# Altium integrated library CbyP.IntLib: 1144 symbols (part 3 of 6)
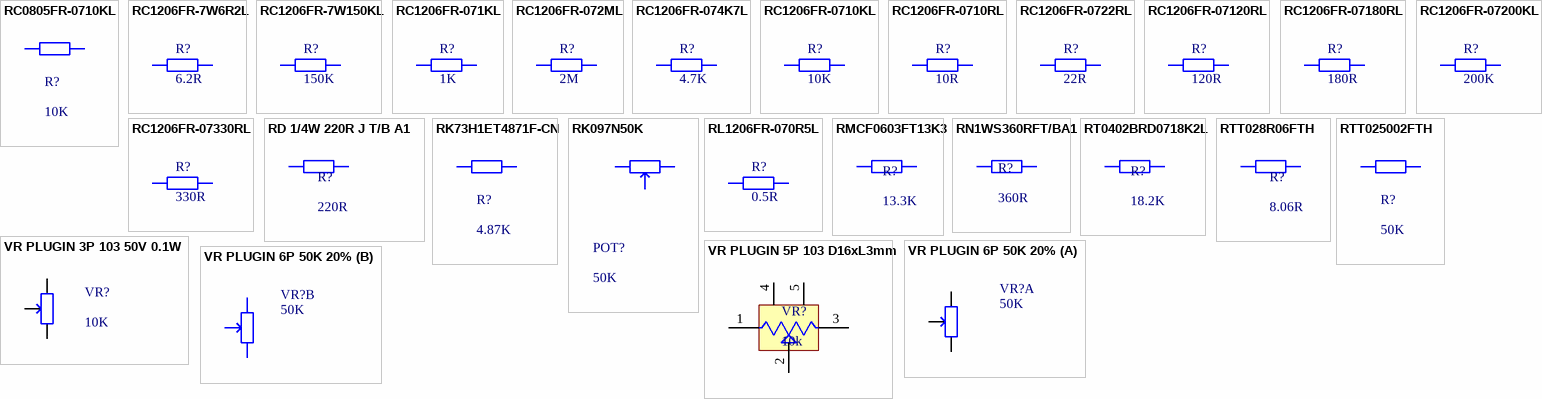
[diagram p43: symbols RC0805FR-0710KL to VR PLUGIN 6P 50K 20%]

## RC1206FR-0710KL
designator R?, comment 10K
RES 10kΩ ±1% 250mW 1206; Manufacturer: YAGEO; Mfr.Part #: RC1206FR-0710KL; LCSC Part #: C132649; Package: 1206
footprint RES-1206
pins: 1, 2

## RC1206FR-0710RL
designator R?, comment 10R
10Ω 250mW 200V Thick Film Resistor ±1% ±200ppm/℃ 1206 Chip Resistor - Surface Mount RoHS; Manufacturer: YAGEO; Mfr.Part #: RC1206FR-0710RL; LCSC Part #: C108080; Package: 1206; DigiKey Part Number: 311-10.0FRTR-ND
footprint RES-1206
pins: 1, 2

## RC1206FR-0722RL
designator R?, comment 22R
22Ω 250mW 200V Thick Film Resistor ±100ppm/℃ ±1% 1206 Chip Resistor - Surface Mount RoHS; Manufacturer: YAGEO; Mfr.Part #: RC1206FR-0722RL; Package: 1206; LCSC Part #: C114943; DigiKey Part Number: 311-22.0FRTR-ND
footprint RES-1206
pins: 1, 2

## RC1206FR-07120RL
designator R?, comment 120R
120Ω 250mW 200V ±100ppm/℃ Thick Film Resistor ±1% 1206 Chip Resistor - Surface Mount RoHS; Manufacturer: YAGEO; Mfr.Part #: RC1206FR-07120RL; Package: 1206; LCSC Part #: C114928; DigiKey Part Number: 311-120FRTR-ND
footprint RES-1206
pins: 1, 2

## RC1206FR-07180RL
designator R?, comment 180R
180Ω 250mW 200V Thick Film Resistor ±100ppm/℃ ±1% 1206 Chip Resistor - Surface Mount RoHS; Manufacturer: YAGEO; Mfr.Part #: RC1206FR-07180RL; LCSC Part #: C137380; Package: 1206; DigiKey Part Number: 311-180FRTR-ND
footprint RES-1206
pins: 1, 2

## RC1206FR-07200KL
designator R?, comment 200K
200kΩ 250mW 200V Thick Film Resistor ±100ppm/℃ ±1% 1206 Chip Resistor - Surface Mount RoHS; Manufacturer: YAGEO; Mfr.Part #: RC1206FR-07200KL; Package: 1206; LCSC Part #: C114937; DigiKey Part Number: 311-200KFRTR-ND
footprint RES-1206
pins: 1, 2

## RC1206FR-07330RL
designator R?, comment 330R
250mW 330Ω 200V Thick Film Resistor ±100ppm/℃ ±1% 1206 Chip Resistor - Surface Mount RoHS; Manufacturer: YAGEO; Mfr.Part #: RC1206FR-07330RL; LCSC Part #: C114944; Package: 1206; DigiKey Part Number: 311-330FRTR-ND
footprint RES-1206
pins: 1, 2

## RD 1/4W 220R J T/B A1
designator R?, comment 220R
Carbon Film Resistor 220Ω 250mW 0ppm/℃~+500ppm/℃ ±5% Through Hole,D2.4xL6.5mm Through Hole Resistors ROHS; Manufacturer: TyoHM; Mfr.Part #: RD 1/4W 220R J T/B A1; Package: Through Hole,D2.4xL6.5mm; LCSC Part #: C433749; DigiKey Part Number: NO
footprint Plugin,D2.4xL6.5mm
pins: 1, 2

## RK73H1ET4871F-CN
designator R?, comment 4.87K
62.5mW 4.87kΩ Thick Film Resistor ±1% 0402 Chip Resistor - Surface Mount RoHS; Manufacturer: ChipNobo; Mfr.Part #: RK73H1ET4871F-CN; Package: 0402; LCSC Part #: C42396694; DigiKey Part Number: NO
footprint RES-0402
pins: 1, 2

## RK097N50K
designator POT?, comment 50K
±10%  50kΩ Through Hole Carbon Film Potentiometer; Mfr.Part #: RK097N50K; Manufacturer: uxcell; Package: Through Hole; LCSC Part #: NO; DigiKey Part Number: NO; ComponentLink1Description: Link; ComponentLink2Description: Link 1
footprint RK097N-1
pins: 1, 2, 3

## RL1206FR-070R5L
designator R?, comment 0.5R
250mW 500mΩ ±300ppm/℃ Thick Film Resistor ±1% 1206 Chip Resistor - Surface Mount RoHS; Manufacturer: YAGEO; Mfr.Part #: RL1206FR-070R5L; LCSC Part #: C327075; Package: 1206; DigiKey Part Number: 311-0.5LWTR-ND
footprint RES-1206
pins: 1, 2

## RMCF0603FT13K3
designator R?, comment 13.3K
13.3 kOhms ±1% 0.1W, 1/10W Chip Resistor 0603 (1608 Metric) Automotive AEC-Q200 Thick Film; Manufacturer: Stackpole Electronics Inc; Mfr.Part #: RMCF0603FT13K3; Package: 0603; DigiKey Part Number: RMCF0603FT13K3TR-ND
footprint RES-0603
pins: 1, 2

## RN1WS360RFT/BA1
designator R?, comment 360R
360Ω 1W 350V Metal Film Resistor ±50ppm/℃ ±1% Through Hole,D3.3xL9.2mm Through Hole Resistors RoHS; Manufacturer: YAGEO; Mfr.Part #: RN1WS360ΩFT/BA1; Package: Through Hole,D3.3xL9.2mm; LCSC Part #: C385379; DigiKey Part Number: NO; ComponentLink1Description: Link; ComponentLink1URL: https://www.lcsc.com/product-detail/C108661.html?s_z=n_33r; ComponentLink2Description: Link 1
footprint Plugin,D3.3xL9.2mm
pins: 1, 2

## RT0402BRD0718K2L
designator R?, comment 18.2K
62.5mW Thin Film Resistor 50V ±25ppm/℃ ±0.1% 18.2kΩ 0402 Chip Resistor - Surface Mount ROHS; Manufacturer: YAGEO; Mfr.Part #: RT0402BRD0718K2L; Package: 0402; LCSC Part #: C852578
footprint RES-0402
pins: 1, 2

## RTT028R06FTH
designator R?, comment 8.06R
62.5mW 8.06Ω 50V ±200ppm/℃ Thick Film Resistor ±1% 0402 Chip Resistor - Surface Mount ROHS; Manufacturer: RALEC; Mfr.Part #: RTT028R06FTH; Package: 0402; LCSC Part #: C166426
footprint RES-0402
pins: 1, 2

## RTT025002FTH
designator R?, comment 50K
50kΩ 62.5mW 50V ±100ppm/℃ Thick Film Resistor ±1% 0402 Chip Resistor - Surface Mount RoHS; Manufacturer: RALEC; Mfr.Part #: RTT025002FTH; Package: 0402; LCSC Part #: C166559; DigiKey Part Number: NO
footprint RES-0402
pins: 1, 2

## VR PLUGIN 3P 103 50V 0.1W
designator VR?, comment 10K
±25% 100mW 10kΩ Plugin Potentiometers, Variable Resistors ROHS; Manufacturer: BOCHEN(Chengdu Guosheng Tech); Mfr.Part #: RM063-103(10K); Name: VR PLUGIN 3P 103 50V 0.1W; So_Chan_Dan: 0; So_Chan_Cam: 3; Package: Plugin
footprint RM063
pins: 1, 2, 3

## VR PLUGIN 5P 103 D16xL3mm
designator VR?, comment 10k
Name: VR PLUGIN 5P 103 D16xL3mm; So_Chan_Cam: 3; So_Chan_Dan: 0; Mfr.Part #: ?; Manufacturer: ?; Package: ?; Link: ?
footprint BIEN_TRO_NGANG
pins: 1 CCW, 2 WIPER, 3 CW, 4, 5

## VR PLUGIN 6P 50K 20%
designator VR?, comment 50K
Through Hole; Package: Plugin
footprint VR-PLUGIN-2.5-6P-1
part A pins: 4, 5, 6
part B pins: 1, 2, 3


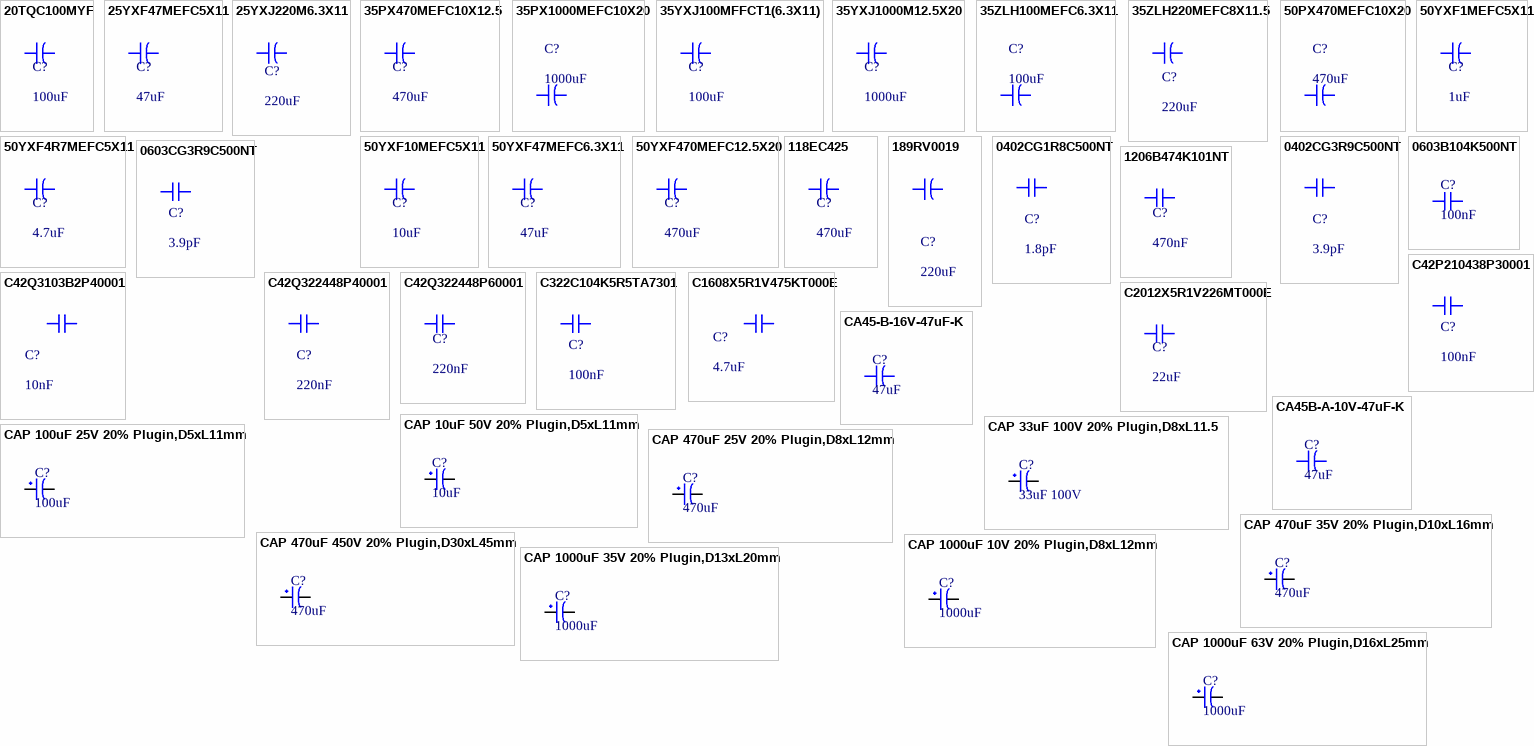
[diagram p13: symbols 20TQC100MYF to CAP 1000uF 63V 20% Plugin,D16xL25mm]

## 20TQC100MYF
designator C?, comment 100uF
100uF ±20% 20V Tantalum Capacitors 55mΩ@100kHz; Manufacturer: PANASONIC; Mfr.Part #: 20TQC100MYF; Package: SMD; LCSC Part #: C139578; DigiKey Part Number: P16503TR-ND; ComponentLink1Description: Link; ComponentLink1URL: https://www.lcsc.com/product-detail/C139578.html; ComponentLink2Description: Link 1; ComponentLink2URL: https://www.digikey.com/en/products/detail/panasonic-electronic-components/20TQC100MYF/4204835?s=N4IgTCBcDa4AwBUCKBhAjHOBZAmgMRAF0BfIA
footprint CAP_20TQC100MYF
pins: 1, 2

## 25YXF47MEFC5X11
designator C?, comment 47uF
47uF 25V Aluminum Electrolytic Capacitors Through Hole,D5xL11mm 5000hrs@105℃; Manufacturer: Rubycon; Mfr.Part #: 25YXF47MEFC5X11; Package: Through Hole,D5xL11mm; LCSC Part #: C88724; DigiKey Part Number: 1189-1858-ND; ComponentLink1Description: Link; ComponentLink1URL: https://www.lcsc.com/product-detail/C88724.html; ComponentLink2Description: Link 1; ComponentLink2URL: https://www.digikey.com/en/products/detail/rubycon/25YXF47MEFC5X11/3562864?s=N4IgTCBcDa4KwE0AaAxALAdgLIFEUGE4kBGYkAXQF8g
footprint PLUGIN,D5xL11mm
pins: 1, 2

## 25YXJ220M6.3X11
designator C?, comment 220uF
220uF 25V Aluminum Electrolytic Capacitors Through Hole,D6.3xL11mm 7000hrs@105℃; Manufacturer: Rubycon; Mfr.Part #: 25YXJ220M6.3X11; Package: Through Hole,D6.3xL11mm; LCSC Part #: C88729; DigiKey Part Number: 1189-2913-ND; ComponentLink1Description: Link; ComponentLink1URL: https://www.lcsc.com/product-detail/C88729.html; ComponentLink2Description: Link 1; ComponentLink2URL: https://www.digikey.com/en/products/detail/rubycon/25YXJ220M6-3X11/3563124?s=N4IgTCBcDa4KwE0AaApMYAMBZAbAOgGYkBGYkAXQF8g
footprint PLUGIN,D6.3xL12mm
pins: 1, 2

## 35PX470MEFC10X12.5
designator C?, comment 470uF
470uF 35V Aluminum Electrolytic Capacitors Through Hole,D10xL12.5mm 2000hrs@105℃; Manufacturer: Rubycon; Mfr.Part #: 35PX470MEFC10X12.5; Package: Through Hole,D10xL12.5mm; LCSC Part #: C127917; DigiKey Part Number: 1189-1280-ND; ComponentLink1Description: Link; ComponentLink1URL: https://www.lcsc.com/product-detail/C127917.html; ComponentLink2Description: Link 1; ComponentLink2URL: https://www.digikey.com/en/products/detail/rubycon/35PX470MEFC10X12-5/3134236?s=N4IgTCBcDaIMwFYAKANALAdgAwFkCiAYgMICMWKJYAdAiALoC%2BQA
footprint Plugin,D10xL12.5mm
pins: 1, 2

## 35PX1000MEFC10X20
designator C?, comment 1000uF
1000uF 35V Aluminum Electrolytic Capacitors Through Hole,D10xL20mm 2000hrs@105℃; Manufacturer: Rubycon; Mfr.Part #: 35PX1000MEFC10X20; So_Chan_Cam: 2; LCSC Part #: C136014; Package: Through Hole,D10xL20mm; DigiKey Part Number: 1189-1745-ND; ComponentLink1Description: Link; ComponentLink1URL: https://www.lcsc.com/product-detail/C136014.html?s_z=n_35PX1000MEFC10X20; ComponentLink2Description: Link 1; ComponentLink2URL: https://www.digikey.com/en/products/detail/rubycon/35PX1000MEFC10X20/3563769?s=N4IgTCBcDaIMwFYAKANAjABiwWQKIDEBhTFMDEAXQF8g
footprint Plugin,D10xL20mm
pins: 1, 2

## 35YXJ100MFFCT1(6.3X11)
designator C?, comment 100uF
100uF 35V Aluminum Electrolytic Capacitors Through Hole,D6.3xL11mm 7000hrs@105℃; Manufacturer: Rubycon; Mfr.Part #: 35YXJ100MFFCT1(6.3X11); Package: Through Hole,D6.3xL11mm; LCSC Part #: C3035369; DigiKey Part Number: NO; ComponentLink1Description: Link; ComponentLink1URL: https://www.lcsc.com/product-detail/C3035369.html?spm=wm.fly.bg.25.xh&lcsc_vid=FAdbA1BQFQNeV1UEFlgLA1FWRVFXUVBeEwJXVAFQRVUxVlNRQ1NbVF1fQ1ReUzsOAxUeFF5JWBYZEEoKFBINSQcJGk4dAgUUFAk%3D; ComponentLink2Description: Link 1
footprint PLUGIN,D6.3xL11mm
footprint PLUGIN,D6.3xL11mm-SIDE
pins: 1, 2

## 35YXJ1000M12.5X20
designator C?, comment 1000uF
1000uF 35V Aluminum Electrolytic Capacitors Through Hole,D12.5xL20mm 10000hrs@105℃; Manufacturer: Rubycon; Mfr.Part #: 35YXJ1000M12.5X20; Package: Through Hole,D12.5xL20mm; LCSC Part #: C88743; DigiKey Part Number: 1189-1295-ND; ComponentLink1Description: Link; ComponentLink1URL: https://www.lcsc.com/product-detail/C88743.html?s_z=n_35YXJ1000M12.5X20; ComponentLink2Description: Link 1; ComponentLink2URL: https://www.digikey.com/en/products/detail/rubycon/35YXJ1000M12-5X20/3134251?s=N4IgTCBcDaIMwFYCaANAUgRgAw4LIbADoEUwsQBdAXyA
footprint Plugin,D12.5xL20mm
pins: 1, 2

## 35ZLH100MEFC6.3X11
designator C?, comment 100uF
CAP ALUM 100uF ±20% 35V TH; Manufacturer: Rubycon; Mfr.Part #: 35ZLH100MEFC6.3X11; LCSC Part #: C109392; Package: Through Hole,D6.3xL11mm
footprint PLUGIN,D6.3xL11mm
pins: 1, 2

## 35ZLH220MEFC8X11.5
designator C?, comment 220uF
220uF 35V Aluminum Electrolytic Capacitors Through Hole,D8xL11.5mm 8000hrs@105℃; Manufacturer: Rubycon; Mfr.Part #: 35ZLH220MEFC8X11.5; LCSC Part #: C107639; Package: Through Hole,D8xL11.5mm; DigiKey Part Number: 1189-1863-ND; ComponentLink1Description: Link; ComponentLink1URL: https://www.lcsc.com/product-detail/C107639.html?s_z=n_35ZLH220MEFC8X11.5; ComponentLink2Description: Link 1; ComponentLink2URL: https://www.digikey.com/en/products/detail/rubycon/35ZLH220MEFC8X11-5/3563385?s=N4IgTCBcDaIMwFYBaAZAEmMAGAsgUQDEBhADgA0BGCgOgRAF0BfIA
footprint Plugin,D8xL11.5mm
pins: 1, 2

## 50PX470MEFC10X20
designator C?, comment 470uF
470uF 50V Aluminum Electrolytic Capacitors Through Hole,D10xL20mm 2000hrs@105℃; Manufacturer: Rubycon; Mfr.Part #: 50PX470MEFC10X20; LCSC Part #: C88733; Package: Through Hole,D10xL20mm; DigiKey Part Number: 1189-4213-ND; ComponentLink1Description: Link; ComponentLink1URL: https://www.lcsc.com/product-detail/C88733.html; ComponentLink2Description: Link 1; ComponentLink2URL: https://www.digikey.com/en/products/detail/rubycon/50PX470MEFC10X20/3563766?s=N4IgTCBcDaIKwAYAKANALAdgQWQKIDEBhARgRTARAF0BfIA
footprint Plugin,D10xL20mm
pins: 1, 2

## 50YXF1MEFC5X11
designator C?, comment 1uF
1uF 50V Aluminum Electrolytic Capacitors Through Hole,D5xL11mm; Manufacturer: Rubycon; Mfr.Part #: 50YXF1MEFC5X11; Package: Through Hole,D5xL11mm; LCSC Part #: C2927584; DigiKey Part Number: 1189-1878-ND; ComponentLink1Description: Link; ComponentLink1URL: https://www.lcsc.com/product-detail/C2927584.html; ComponentLink2Description: Link 1; ComponentLink2URL: https://www.digikey.com/en/products/detail/rubycon/50YXF1MEFC5X11/3562875?s=N4IgTCBcDaIKwAYCaANAYgRgLIFE0GE4UMMQBdAXyA
footprint PLUGIN,D5xL11mm
pins: 1, 2

## 50YXF4R7MEFC5X11
designator C?, comment 4.7uF
4.7uF 50V Aluminum Electrolytic Capacitors Through Hole,D5xL11mm 5000hrs@105℃; Manufacturer: Rubycon; Mfr.Part #: 50YXF4R7MEFC5X11; Package: Through Hole,D5xL11mm; LCSC Part #: C88759; DigiKey Part Number: 1189-1862-ND; ComponentLink1Description: Link; ComponentLink1URL: https://www.lcsc.com/product-detail/C88759.html; ComponentLink2Description: Link 1; ComponentLink2URL: https://www.digikey.com/en/products/detail/rubycon/50YXF4-7MEFC5X11/3562866?s=N4IgTCBcDaIKwAYCaANAYgFgEoHYCyAomgMJwoCM5IAugL5A
footprint PLUGIN,D5xL11mm
pins: 1, 2

## 50YXF10MEFC5X11
designator C?, comment 10uF
10uF 50V Aluminum Electrolytic Capacitors Through Hole,D5xL11mm 5000hrs@105℃; Manufacturer: Rubycon; Mfr.Part #: 50YXF10MEFC5X11; Package: Through Hole,D5xL11mm; LCSC Part #: C88726; DigiKey Part Number: 1189-1852-ND; ComponentLink1Description: Link; ComponentLink1URL: https://www.lcsc.com/product-detail/C88726.html; ComponentLink2Description: Link 1; ComponentLink2URL: http://digikey.com/en/products/detail/rubycon/50YXF10MEFC5X11/3562878?s=N4IgTCBcDaIKwAYCaANAYgRgQWQKJoGE4UMMQBdAXyA
footprint PLUGIN,D5xL11mm
pins: 1, 2

## 50YXF47MEFC6.3X11
designator C?, comment 47uF
47uF 50V Aluminum Electrolytic Capacitors Through Hole,D6.3xL11mm 5000hrs@105℃; Manufacturer: Rubycon; Mfr.Part #: 50YXF47MEFC6.3X11; Package: Through Hole,D6.3xL11mm; LCSC Part #: C107641; DigiKey Part Number: 1189-1854-ND; ComponentLink1Description: Link; ComponentLink1URL: https://www.lcsc.com/product-detail/C107641.html; ComponentLink2Description: Link 1; ComponentLink2URL: https://www.digikey.com/en/products/detail/rubycon/50YXF47MEFC6-3X11/3563091?s=N4IgTCBcDaIKwAYCaANAYgFgOwFkCiaAwgGwB0AzCgIxUgC6AvkA
footprint PLUGIN,D6.3xL11mm-SIDE
footprint PLUGIN,D6.3xL11mm-SIDE
pins: 1, 2

## 50YXF470MEFC12.5X20
designator C?, comment 470uF
470uF 50V Aluminum Electrolytic Capacitors Through Hole,D12.5xL20mm 10000hrs@105℃; Manufacturer: Rubycon; Mfr.Part #: 50YXF470MEFC12.5X20; Package: Through Hole,D12.5xL20mm; LCSC Part #: C88856; DigiKey Part Number: 1189-50YXF470MEFC12.5X20-ND; ComponentLink1Description: Link; ComponentLink1URL: https://www.lcsc.com/product-detail/C88856.html; ComponentLink2Description: Link 1; ComponentLink2URL: https://www.digikey.com/en/products/detail/rubycon/50YXF470MEFC12-5X20/3564022?s=N4IgTCBcDaIKwAYCaANAYgFgOwILIFE0BhARjADo4UwEQBdAXyA
footprint Plugin,D12.5xL20mm
pins: 1, 2

## 118EC425
designator C?, comment 470uF
CAP ALUM HYBRID 470uF ±20% 16V SMD; Manufacturer: KNSCHA; Mfr.Part #: 118EC425; Package: SMD,D8xL10mm; LCSC Part #: C46528077
footprint SMD,D8xL10mm
pins: 1, 2

## 189RV0019
designator C?, comment 220uF
220uF 35V 600mA@100KHz 160mΩ@100KHz ±20% SMD,D6.3xL7.7mm Aluminum Electrolytic Capacitors - SMD ROHS; Manufacturer: KNSCHA; Mfr.Part #: 189RV0019; Package: SMD,D6.3xL7.7mm; LCSC Part #: C7471881
footprint SMD,D6.3xL7.7mm
pins: 1, 2

## 0402CG1R8C500NT
designator C?, comment 1.8pF
CAP CER 1.8pF 50V C0G 0402; Manufacturer: FH; Mfr.Part #: 0402CG1R8C500NT; Package: 0402; LCSC Part #: C1553
footprint CAP-0402
pins: 1, 2

## 0402CG3R9C500NT
designator C?, comment 3.9pF
CAP CER 3.9pF 50V C0G 0402; Manufacturer: FH; Mfr.Part #: 0402CG3R9C500NT; Package: 0402; LCSC Part #: C1566
footprint CAP-0402
pins: 1, 2

## 0603B104K500NT
designator C?, comment 100nF
100nF ±10% 50V Ceramic Capacitor X7R 0603; Manufacturer: FH; Mfr.Part #: 0603B104K500NT; Package: 0603; LCSC Part #: C30926; DigiKey Part Number: NO; ComponentLink1Description: Link; ComponentLink1URL: https://www.lcsc.com/product-detail/C30926.html?s_z=n_0603B114K500NT; ComponentLink2Description: Link 1
footprint CAP-0603
pins: 1, 2

## 0603CG3R9C500NT
designator C?, comment 3.9pF
3.9pF 50V Ceramic Capacitor C0G 0603; Manufacturer: FH; Mfr.Part #: 0603CG3R9C500NT; Package: 0603; LCSC Part #: C1662; DigiKey Part Number: NO; ComponentLink1Description: Link; ComponentLink1URL: https://www.lcsc.com/product-detail/C1662.html?spm=wm.fly.bg.1.xh&lcsc_vid=QwdcUVxUFAdbVwUFRQBWBVECTlNYX1QAQFddU1EFQ1kxVlNRQ1NeVF1TQVhaVTsOAxUeFF5JWBYZEEoKFBINSQcJGk4dAgUUFAk%3D; ComponentLink2Description: Link 1
footprint CAP-0603
pins: 1, 2

## 1206B474K101NT
designator C?, comment 470nF
470nF ±10% 100V Ceramic Capacitor X7R 1206; Manufacturer: FH; Mfr.Part #: 1206B474K101NT; Package: 1206; LCSC Part #: C507059; DigiKey Part Number: NO; ComponentLink1Description: Link; ComponentLink1URL: https://www.lcsc.com/product-detail/C507059.html; ComponentLink2Description: Link 1
footprint CAP-1206 - 1
pins: 1, 2

## C42P210438P30001
designator C?, comment 100nF
CAP SAFETY 100nF ±10% 275V TH; Manufacturer: WALSON; Mfr.Part #: C42P210438P30001; Package: Through Hole,P=7.5mm; LCSC Part #: C46638855
footprint Through Hole, P=7.5mm, L=10mm, W=5mm, H=11mm
pins: 1, 2

## C42Q3103B2P40001
designator C?, comment 10nF
10nF ±10% 275V 310V Safety Capacitor X2 Through Hole,P=10mm; Manufacturer: WALSON; Mfr.Part #: CC0603JRX7R9BB103; Package: Through Hole,P=10mm; LCSC Part #: C46638843; DigiKey Part Number: NO; ComponentLink1Description: Link; ComponentLink1URL: https://www.lcsc.com/product-detail/C46638843.html; ComponentLink2Description: Link 1
footprint Through Hole, P=10mm, L=12mm, W=6mm,  H=12mm
pins: 1, 2

## C42Q322448P40001
designator C?, comment 220nF
CAP SAFETY 220nF ±10% 275V 310V TH; Manufacturer: WALSON; Mfr.Part #: C42Q322448P40001; Package: Through Hole,P=10mm; LCSC Part #: C46638866
footprint Through Hole, P=10mm, L=13mm, W=7mm, H=13mm
pins: 1, 2

## C42Q322448P60001
designator C?, comment 220nF
CAP SAFETY 220nF ±10% 275V 310V TH; Manufacturer: WALSON; Mfr.Part #: C42Q322448P60001; Package: Through Hole,P=15mm; LCSC Part #: C46638867
footprint Through Hole, P=15mm, L=18mm, W=6mm, H=12mm
pins: 1, 2

## C322C104K5R5TA7301
designator C?, comment 100nF
CAP CER 100nF 50V X7R TH; Manufacturer: KEMET; Mfr.Part #: C322C104K5R5TA7301; Package: Through Hole,P=5.08mm; LCSC Part #: C600235
footprint Through Hole,P=5.08mm
pins: 1, 2

## C1608X5R1V475KT000E
designator C?, comment 4.7uF
4.7uF ±10% 35V Ceramic Capacitor X5R 0603; Manufacturer: TDK; Mfr.Part #: C1608X5R1V475KT000E; Package: 0603; LCSC Part #: C329940; DigiKey Part Number: 445-9064-2-ND; ComponentLink1Description: Link; ComponentLink1URL: https://www.lcsc.com/product-detail/C329940.html?s_z=n_c329940; ComponentLink2Description: Link 1; ComponentLink2URL: https://www.digikey.com/en/products/detail/tdk-corporation/C1608X5R1V475K080AC/3648577?s=N4IgTCBcDaIMIEYBsAGAHADQKwCUEDUAWAdiwGkAVFagURAF0BfIA
footprint CAP-0603
pins: 1, 2

## C2012X5R1V226MT000E
designator C?, comment 22uF
22uF ±20% 35V Ceramic Capacitor X5R 0805; Manufacturer: TDK; Mfr.Part #: C2012X5R1V226MT000E; Package: 0805; LCSC Part #: C338080; DigiKey Part Number: 445-14428-2-ND; ComponentLink1Description: Link; ComponentLink1URL: https://www.lcsc.com/product-detail/C338080.html?spm=wm.fly.bg.0.xh&lcsc_vid=FAdbA1BQFQNeV1UEFlgLA1FWRVFXUVBeEwJXVAFQRVUxVlNRQ1NbU11QRVRcVTsOAxUeFF5JWBYZEEoKFBINSQcJGk4dAgUUFAk%3D; ComponentLink2Description: Link 1; ComponentLink2URL: https://www.digikey.com/en/products/detail/tdk/C2012X5R1V226M125AC/3951664?s=N4IgTCBcDaIMJgAwEYwA0CsAlZA1MYAbALIAqiFAoiALoC%2BQA
footprint CAP-0805
footprint CAP-0805-1
pins: 1, 2

## CA45-B-16V-47uF-K
designator C?, comment 47uF
47uF 16V 3Ω@100kHz ±10% CASE-B-3528-19(mm) Tantalum Capacitors ROHS; Manufacturer: CEC(Zhenhua XinYun); Mfr.Part #: CA45-B-16V-47uF-K; Package: CASE-B-3528-19(mm); LCSC Part #: C136751
footprint CASE-B-3528-19(mm)
pins: 1, 2

## CA45B-A-10V-47uF-K
designator C?, comment 47uF
47uF 10V ±10% CASE-A-3216-16(mm) Tantalum Capacitors ROHS; Manufacturer: CEC(Zhenhua XinYun); Mfr.Part #: CA45B-A-10V-47uF-K; Package: CASE-A-3216-16(mm); LCSC Part #: C41415735; DigiKey Part Number: NO
footprint CASE-A-3216-18(mm)
pins: 1, 2

## CAP 10uF 50V 20% Plugin,D5xL11mm
designator C?, comment 10uF
10uF 50V ±20% Plugin,D5xL11mm Aluminum Electrolytic Capacitors - Leaded ROHS; Manufacturer: AISHI(Aihua Group); Mfr.Part #: ERS1HM100D11OT; Name: CAP 10uF 50V 20% Plugin,D5xL11mm; So_Chan_Cam: 2; So_Chan_Dan: 0; Package: Plugin,D5xL11mm
footprint PLUGIN,D5xL11mm
pins: 1, 2

## CAP 33uF 100V 20% Plugin,D8xL11.5
designator C?, comment 33uF 100V
33uF 100V ±20% 140mA@120Hz Plugin,D8xL11.5mm Aluminum Electrolytic Capacitors - Leaded ROHS; Manufacturer: Rubycon; Mfr.Part #: 100PX33MEFC8X11.5; Name: CAP 33uF 100V 20% Plugin,D8xL11.5; So_Chan_Dan: 0; So_Chan_Cam: 2; Package: Plugin,D8xL11.5mm
footprint Plugin,D8xL11.5mm
pins: 1, 2

## CAP 100uF 25V 20% Plugin,D5xL11mm
designator C?, comment 100uF
100uF 25V ±20% Plugin,D5xL11mm Aluminum Electrolytic Capacitors - Leaded ROHS; Manufacturer: Rubycon; Mfr.Part #: 25YXJ100MT15X11; Name: CAP 100uF 25V 20% Plugin,D5xL11mm; So_Chan_Cam: 2; So_Chan_Dan: 0; Package: Plugin,D5xL11mm
footprint PLUGIN,D5xL11mm
pins: 1, 2

## CAP 470uF 25V 20% Plugin,D8xL12mm
designator C?, comment 470uF
470uF 25V ±20% Plugin,D8xL12mm Aluminum Electrolytic Capacitors - Leaded ROHS; Manufacturer: CX(Dongguan Chengxing Elec); Mfr.Part #: KM477M025F12RR0VH2FP0; Name: CAP 470uF 25V 20% Plugin,D8xL12mm; So_Chan_Dan: 0; So_Chan_Cam: 2; Package: Plugin,D8xL12mm
footprint Plugin,D8xL12mm
pins: 1, 2

## CAP 470uF 35V 20% Plugin,D10xL16mm
designator C?, comment 470uF
470uF 35V ±20% Plugin,D10xL16mm Aluminum Electrolytic Capacitors - Leaded ROHS; Manufacturer: Rubycon; Mfr.Part #: 35YXJ470M10x16; Name: CAP 470uF 35V 20% Plugin,D10xL16mm; So_Chan_Dan: 0; So_Chan_Cam: 2; Package: Plugin,D10xL16mm
footprint Plugin,D10xL16mm
pins: 1, 2

## CAP 470uF 450V 20% Plugin,D30xL45mm
designator C?, comment 470uF
470uF 450V 2.05A@120Hz ±20% 10mm Plugin,D30xL45mm Horn-Type Electrolytic Capacitors ROHS; Manufacturer: Rubycon; Mfr.Part #: 450MXH470MEFCSN30X45; Name: CAP 470uF 450V 20% Plugin,D30xL45mm; So_Chan_Dan: 0; So_Chan_Cam: 2; Package: Plugin,D30xL45mm
footprint Plugin,D30xL45mm
pins: 1, 2

## CAP 1000uF 10V 20% Plugin,D8xL12mm
designator C?, comment 1000uF
1000uF 10V ±20% 600mA@10kHz Plugin,D8xL12mm Aluminum Electrolytic Capacitors - Leaded ROHS; Manufacturer: Rubycon; Mfr.Part #: 10PX1000MEFC8X11.5; Name: CAP 1000uF 10V 20% Plugin,D8xL12mm; So_Chan_Dan: 0; So_Chan_Cam: 2; Package: Plugin,D8xL12mm
footprint Plugin,D8xL12mm
footprint Plugin,D8xL12mm-SIDE
pins: 1, 2

## CAP 1000uF 35V 20% Plugin,D13xL20mm
designator C?, comment 1000uF
1000uF 35V ±20% Plugin,D13xL20mm Aluminum Electrolytic Capacitors - Leaded ROHS; Manufacturer: CX(Dongguan Chengxing Elec); Mfr.Part #: KM108M035J20RR0VH2FP0; Name: CAP 1000uF 35V 20% Plugin,D13xL20mm; So_Chan_Dan: 0; So_Chan_Cam: 2; Package: Plugin,D13xL20mm
footprint Plugin,D13xL20mm
footprint Plugin,D13xL20mm-SIDE
pins: 1, 2

## CAP 1000uF 63V 20% Plugin,D16xL25mm
designator C?, comment 1000uF
1000uF 63V ±20% Plugin,D16xL25mm Aluminum Electrolytic Capacitors - Leaded ROHS; Manufacturer: Rubycon; Mfr.Part #: 63YXJ1000M16X25; Name: CAP 1000uF 63V 20% Plugin,D16xL25mm; So_Chan_Dan: 0; So_Chan_Cam: 2; Package: Plugin,D16xL25mm
footprint PLUGIN,D16xL25mm
pins: 1, 2

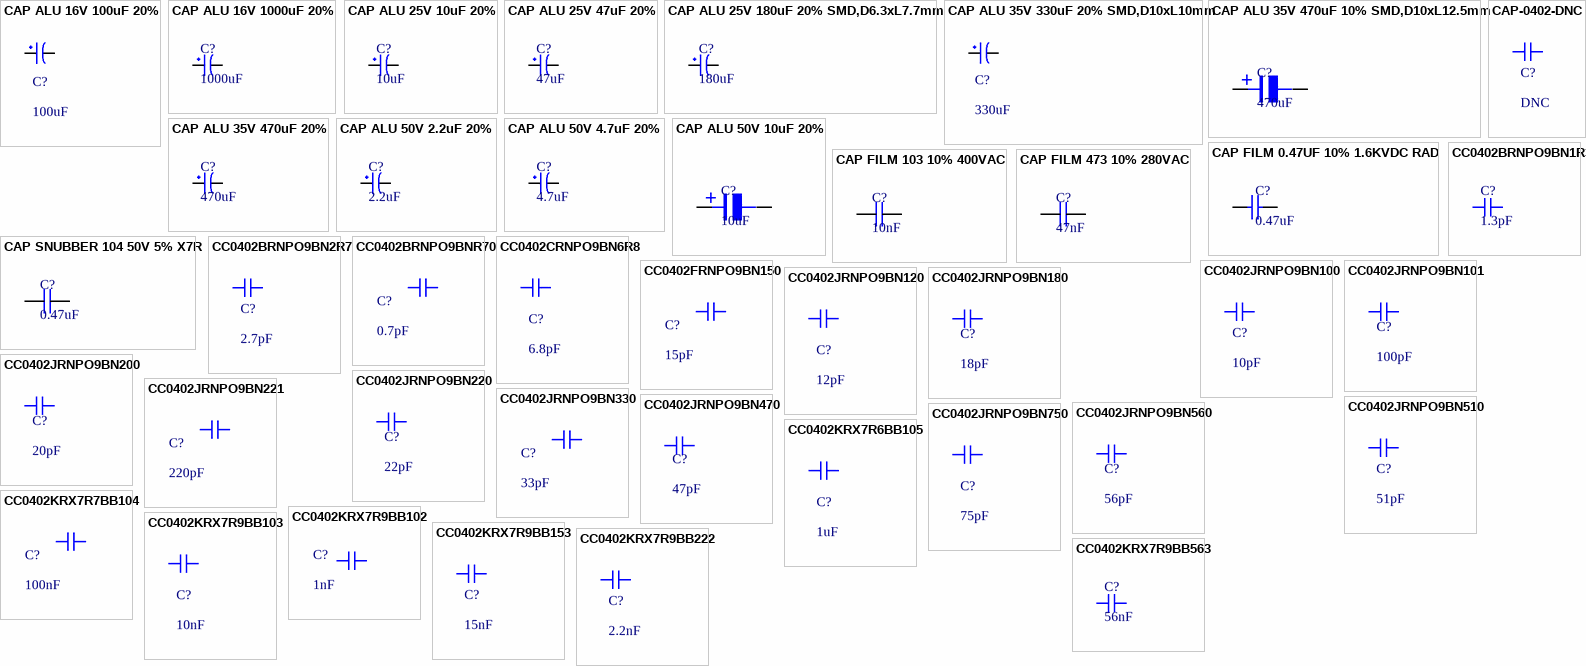
[diagram p14: symbols CAP ALU 16V 100uF 20% to CC0402KRX7R9BB563]

## CAP ALU 16V 100uF 20%
designator C?, comment 100uF
100uF 16V 125mA@120Hz ±20% SMD,D6.3xL6.1mm Aluminum Electrolytic Capacitors - SMD ROHS; Manufacturer: Rubycon; Mfr.Part #: 16TZV100M6.3X6.1; Name: CAP ALU 16V 100uF 20%; So_Chan_Dan: 2; So_Chan_Cam: 0; Package: SMD,D6.3xL6.1mm
footprint SMD,D6.3xL6.1mm
pins: 1, 2

## CAP ALU 16V 1000uF 20%
designator C?, comment 1000uF
1000uF 16V 300mA@120kHz ±20% SMD,D10xL10.5mm Aluminum Electrolytic Capacitors - SMD ROHS; Manufacturer: KNSCHA; Mfr.Part #: XT1000UF16V90RV0100; Name: CAP ALU 16V 1000uF 20%; So_Chan_Dan: 2; So_Chan_Cam: 0; Package: SMD,D10xL10.5mm
footprint SMD,D10xL10.5mm
pins: 1, 2

## CAP ALU 25V 10uF 20%
designator C?, comment 10uF
10uF 25V 25mA@120Hz ±20% SMD,D4xL5.5mm Aluminum Electrolytic Capacitors - SMD ROHS; Manufacturer: Rubycon; Mfr.Part #: 25SEV10M4X5.5; Name: CAP ALU 25V 10uF 20%; So_Chan_Dan: 2; So_Chan_Cam: 0; Package: SMD,D4xL5.5mm
footprint SMD,D4xL5.5mm
pins: 1, 2

## CAP ALU 25V 47uF 20%
designator C?, comment 47uF
47uF 25V 60mA@120Hz ±20% SMD,D6.3xL5.5mm Aluminum Electrolytic Capacitors - SMD ROHS; Manufacturer: Rubycon; Mfr.Part #: 25SEV47M6.3X5.5; Name: CAP ALU 25V 10uF 20%; So_Chan_Dan: 2; So_Chan_Cam: 0; Package: SMD,D6.3xL5.5mm
footprint SMD,D6.3xL5.5mm
pins: 1, 2

## CAP ALU 25V 180uF 20% SMD,D6.3xL7.7mm
designator C?, comment 180uF
180uF 25V 280mA@100kHz 340mΩ@100kHz ±20% SMD,D6.3xL7.7mm Aluminum Electrolytic Capacitors - SMD ROHS; Manufacturer: PANASONIC; Mfr.Part #: EEEFKE181XSP; Name: CAP ALU 25V 180uF 20% SMD,D6.3xL7.7mm; So_Chan_Dan: 0; So_Chan_Cam: 2; Package: SMD,D6.3xL7.7mm
footprint SMD,D6.3xL7.7mm
pins: 1, 2

## CAP ALU 35V 330uF 20% SMD,D10xL10mm
designator C?, comment 330uF
330uF 35V ±20% SMD,D10xL10mm Aluminum Electrolytic Capacitors - SMD ROHS; Manufacturer: Lelon; Mfr.Part #: VZH331M1VTR-1010; Name: CAP ALU 35V 330uF 20% SMD,D10xL10mm; So_Chan_Dan: 2; So_Chan_Cam: 0; Package: SMD,D10xL10mm; Tolerance: 20%
footprint SMD,D10xL10.5mm
pins: 1, 2

## CAP ALU 35V 470uF 10% SMD,D10xL12.5mm
designator C?, comment 470uF
470uF 35V ±10% SMD,D10xL12.5mm Aluminum Electrolytic Capacitors - SMD ROHS; Manufacturer: Lelon; Mfr.Part #: VEJ471K1VTR-1012; Name: CAP ALU 35V 470uF 10% SMD,D10xL12.5mm; So_Chan_Dan: 2; So_Chan_Cam: 0; Package: SMD,D10xL12.5mm; Tolerance: 10%
footprint SMD,D10xL12.5mm
pins: 1, 2
text: +

## CAP ALU 35V 470uF 20%
designator C?, comment 470uF
470uF 35V 310mA@120Hz ±20% SMD,D10xL10.5mm Aluminum Electrolytic Capacitors - SMD ROHS; Manufacturer: KNSCHA; Mfr.Part #: XT470UF35V90RV0080; Name: CAP ALU 35V 470uF 20%; So_Chan_Dan: 2; So_Chan_Cam: 0; Package: SMD,D10xL10.5mm
footprint SMD,D10xL10.5mm
pins: 1, 2

## CAP ALU 50V 2.2uF 20%
designator C?, comment 2.2uF
2.2uF 50V 11mA@120Hz ±20% SMD,D4xL6.1mm Aluminum Electrolytic Capacitors - SMD ROHS; Manufacturer: Rubycon; Mfr.Part #: 50SGV2R2M4X6.1; Name: CAP ALU 50V 2.2uF 20%; So_Chan_Dan: 2; So_Chan_Cam: 0; Package: SMD,D4xL6.1mm
footprint SMD,D4xL6.1mm
pins: 1, 2

## CAP ALU 50V 4.7uF 20%
designator C?, comment 4.7uF
4.7uF 50V 18mA@120Hz ±20% SMD,D4xL5.5mm Aluminum Electrolytic Capacitors - SMD ROHS; Manufacturer: Rubycon; Mfr.Part #: 50SEV4R7M4X5.5; Name: CAP ALU 50V 4.7uF 20%; So_Chan_Dan: 2; So_Chan_Cam: 0; Package: SMD,D4xL5.5mm
footprint SMD,D4xL5.5mm
footprint Plugin,D20xL35mm
pins: 1, 2

## CAP ALU 50V 10uF 20%
designator C?, comment 10uF
10uF 50V 30mA@120Hz ±20% SMD,D5xL5.5mm Aluminum Electrolytic Capacitors - SMD ROHS; Manufacturer: Rubycon; Mfr.Part #: 50SEV10M5X5.5; Name: CAP ALU 50V 10uF 20%; So_Chan_Dan: 2; So_Chan_Cam: 0; Package: SMD,D5xL5.5mm
footprint SMD,D5xL5.5mm
pins: 1, 2
text: +

## CAP FILM 0.47UF 10% 1.6KVDC RAD
designator C?, comment 0.47uF
0.47 µF Film Capacitor 650V 1600V (1.6kV) Polypropylene (PP), Metallized Radial; Manufacturer: WIMA; Mfr.Part #: MKP1T034707F00KSSD; Name: CAP FILM 0.47UF 10% 1.6KVDC RAD; So_Chan_Dan: 0; So_Chan_Cam: 2; Package: Plugin,L41.5xW19xH32mm
footprint Plugin,L41.5xW19xH32mm
pins: 1, 2

## CAP FILM 103 10% 400VAC
designator C?, comment 10nF
10000 pF Film Capacitor 400V 1000V (1kV) Polypropylene (PP), Metallized Radial; Manufacturer: WIMA; Mfr.Part #: MKP4O121003F00KSSD; So_Chan_Dan: 2; Name: CAP FILM 103 10% 400VAC; So_Chan_Cam: 0; Tolarance: 10%; Package: Plugin
footprint MKP4O121003F00
pins: 1, 2

## CAP FILM 473 10% 280VAC
designator C?, comment 47nF
0.047 µF Film Capacitor 280V 630V Polypropylene (PP), Metallized Radial; Manufacturer: WIMA; Mfr.Part #: MKP4J024702F00KSSD; So_Chan_Dan: 2; Name: CAP FILM 473 10% 280VAC; So_Chan_Cam: 0; Tolarance: 10%; Package: Plugin
footprint MKP4O121003F00
pins: 1, 2

## CAP SNUBBER 104 50V 5% X7R
designator C?, comment 0.47uF
50V 100nF X7R ±5% 0603 Multilayer Ceramic Capacitors MLCC - SMD/SMT ROHS; Manufacturer: YAGEO; Mfr.Part #: CC0603JRX7R9BB104; So_Chan_Dan: 2; Name: CAP 0603 104 50V 5% X7R; So_Chan_Cam: 0; Package: 0603; Volt Rated: 50V; Temperature Coefficient: X7R; Tolarance: 5%
footprint PLUGIN,W33xL56mm (FKP1 0.47uF 1.6kV)
pins: 1, 2

## CAP-0402-DNC
designator C?, comment DNC
Do not connect; Manufacturer: NO; Package: 0402; LCSC Part #: NO; Mfr.Part #: NO; DigiKey Part Number: NO
footprint CAP-0402-DNC
pins: 1, 2

## CC0402BRNPO9BN1R3
designator C?, comment 1.3pF
CAP CER 1.3pF 50V NP0 0402; Manufacturer: muRata; Mfr.Part #: CC0402BRNPO9BN1R3; Package: 0403; LCSC Part #: C327229
footprint CAP-0402
pins: 1, 2

## CC0402BRNPO9BN2R7
designator C?, comment 2.7pF
CAP CER 2.7pF 50V NP0 0402; Manufacturer: YAGEO; Mfr.Part #: CC0402BRNPO9BN2R7; Package: 0402; LCSC Part #: C326937
footprint CAP-0402
pins: 1, 2

## CC0402BRNPO9BNR70
designator C?, comment 0.7pF
CAP CER 0.7pF 50V NP0 0402; Manufacturer: YAGEO; Mfr.Part #: CC0402BRNPO9BNR70; Package: 0402; LCSC Part #: C541344
footprint CAP-0402
pins: 1, 2

## CC0402CRNPO9BN6R8
designator C?, comment 6.8pF
CAP CER 6.8pF 50V NP0 0402; Manufacturer: YAGEO; Mfr.Part #: CC0402CRNPO9BN6R8; Package: 0402; LCSC Part #: C189470
footprint CAP-0402
pins: 1, 2

## CC0402FRNPO9BN150
designator C?, comment 15pF
50V 15pF NP0 ±1% 0402 Ceramic Capacitors RoHS; Manufacturer: YAGEO; Mfr.Part #: CC0402FRNPO9BN150; Package: 0402; LCSC Part #: C326803; DigiKey Part Number: 311-1642-2-ND
footprint CAP-0402
pins: 1, 2

## CC0402JRNPO9BN100
designator C?, comment 10pF
10pF ±5% 50V Ceramic Capacitor NP0 0402; Manufacturer: YAGEO; Mfr.Part #: CC0402JRNPO9BN100; Package: 0402; LCSC Part #: C106199; DigiKey Part Number: 311-1014-2-ND; ComponentLink1Description: Link; ComponentLink1URL: https://www.lcsc.com/product-detail/C106199.html?s_z=n_10PF; ComponentLink2Description: Link 1; ComponentLink2URL: https://www.digikey.com/en/products/detail/yageo/CC0402JRNPO9BN100/302748?s=N4IgTCBcDaIMJwAwBZFgFICUByAFA8gJwBC2AjIoiALoC%2BQA
footprint CAP-0402
pins: 1, 2

## CC0402JRNPO9BN101
designator C?, comment 100pF
50V 100pF NP0 ±5% 0402 Ceramic Capacitors ROHS; Manufacturer: YAGEO; Mfr.Part #: CC0402JRNPO9BN101; Package: 0402; LCSC Part #: C106200
footprint CAP-0402
pins: 1, 2

## CC0402JRNPO9BN120
designator C?, comment 12pF
50V 12pF NP0 ±5% 0402 Multilayer Ceramic Capacitors MLCC - SMD/SMT ROHS; Manufacturer: YAGEO; Mfr.Part #: CC0402JRNPO9BN120; Package: 0402; LCSC Part #: C106201
footprint CAP-0402
pins: 1, 2

## CC0402JRNPO9BN180
designator C?, comment 18pF
50V 18pF NP0 ±5% 0402 Ceramic Capacitors RoHS; Manufacturer: YAGEO; Mfr.Part #: CC0402JRNPO9BN180; Package: 0402; LCSC Part #: C106202; DigiKey Part Number: 311-1415-2-ND
footprint CAP-0402
pins: 1, 2

## CC0402JRNPO9BN200
designator C?, comment 20pF
20pF ±5% 50V Ceramic Capacitor NP0 0402; Manufacturer: YAGEO; Mfr.Part #: CC0402JRNPO9BN200; Package: 0402; LCSC Part #: C107000; DigiKey Part Number: 311-1417-2-ND; ComponentLink1Description: Link; ComponentLink1URL: https://www.lcsc.com/product-detail/C107000.html?s_z=n_CC0402JRNPO9BN200; ComponentLink2Description: Link 1; ComponentLink2URL: https://www.digikey.com/en/products/detail/yageo/CC0402JRNPO9BN200/2833582?s=N4IgTCBcDaIMJwAwBZFgFICUByAFA8gJwBC2YiiIAugL5A
footprint CAP-0402
pins: 1, 2

## CC0402JRNPO9BN220
designator C?, comment 22pF
50V 22pF NP0 ±5% 0402 Ceramic Capacitors RoHS; Manufacturer: YAGEO; Mfr.Part #: CC0402JRNPO9BN220; Package: 0402; LCSC Part #: C106203; DigiKey Part Number: 311-1018-2-ND
footprint CAP-0402
pins: 1, 2

## CC0402JRNPO9BN221
designator C?, comment 220pF
220pF ±5% 50V Ceramic Capacitor NP0 0402; Manufacturer: YAGEO; Mfr.Part #: CC0402JRNPO9BN221; Package: 0402; LCSC Part #: C107001; DigiKey Part Number: 311-1416-2-ND; ComponentLink1Description: Link; ComponentLink1URL: https://www.lcsc.com/product-detail/C107001.html?s_z=n_220PF; ComponentLink2Description: Link 1; ComponentLink2URL: https://www.digikey.com/en/products/detail/yageo/CC0402JRNPO9BN221/2833581?s=N4IgTCBcDaIMJwAwBZFgFICUByAFA8gJwBC2YYAjCALoC%2BQA
footprint CAP-0402
pins: 1, 2

## CC0402JRNPO9BN330
designator C?, comment 33pF
33pF ±5% 50V Ceramic Capacitor NP0 0402; Manufacturer: YAGEO; Mfr.Part #: CC0402JRNPO9BN330; Package: 0402; LCSC Part #: C107005; DigiKey Part Number: 311-1020-2-ND; ComponentLink1Description: Link; ComponentLink1URL: https://www.lcsc.com/product-detail/C107005.html?s_z=n_33PF; ComponentLink2Description: Link 1; ComponentLink2URL: https://www.digikey.com/en/products/detail/yageo/CC0402JRNPO9BN330/302754?s=N4IgTCBcDaIMJwAwBZFgFICUByAFA8gJwBC2AzGYiALoC%2BQA
footprint CAP-0402
pins: 1, 2

## CC0402JRNPO9BN470
designator C?, comment 47pF
CAP CER 47pF 50V NP0 0402; Manufacturer: YAGEO; Mfr.Part #: CC0402JRNPO9BN470; Package: 0402; LCSC Part #: C60137
footprint CAP-0402
pins: 1, 2

## CC0402JRNPO9BN510
designator C?, comment 51pF
51pF ±5% 50V Ceramic Capacitor NP0 0402; Manufacturer: YAGEO; Mfr.Part #: CC0402JRNPO9BN510; Package: 0402; LCSC Part #: C281759; DigiKey Part Number: 311-1672-2-ND; ComponentLink1Description: Link; ComponentLink1URL: https://www.lcsc.com/product-detail/C281759.html?s_z=n_51PF; ComponentLink2Description: Link 1; ComponentLink2URL: https://www.digikey.com/en/products/detail/yageo/CC0402JRNPO9BN510/5195081?s=N4IgTCBcDaIMJwAwBZFgFICUByAFA8gJwBC2ArAIyIgC6AvkA
footprint CAP-0603
pins: 1, 2

## CC0402JRNPO9BN560
designator C?, comment 56pF
50V 56pF NP0 ±5% 0402 Ceramic Capacitors RoHS; Manufacturer: YAGEO; Mfr.Part #: CC0402JRNPO9BN560; Package: 0402; LCSC Part #: C107007; DigiKey Part Number: 311-1022-2-ND
footprint CAP-0402
pins: 1, 2

## CC0402JRNPO9BN750
designator C?, comment 75pF
50V 75pF NP0 ±5% 0402 Ceramic Capacitors ROHS; Manufacturer: YAGEO; Mfr.Part #: CC0402JRNPO9BN750; Package: 0402; LCSC Part #: C107010
footprint CAP-0402
pins: 1, 2

## CC0402KRX7R6BB105
designator C?, comment 1uF
CAP CER 1uF 10V X7R 0402; Manufacturer: YAGEO; Mfr.Part #: CC0402KRX7R6BB105; Package: 0402; LCSC Part #: C7500381
footprint CAP-0402
pins: 1, 2

## CC0402KRX7R7BB104
designator C?, comment 100nF
16V 100nF X7R ±10% 0402 Multilayer Ceramic Capacitors MLCC - SMD/SMT ROHS; Manufacturer: YAGEO; Mfr.Part #: CC0402KRX7R7BB104; Package: 0402; LCSC Part #: C60474; DigiKey Part Number: 311-1338-2-ND
footprint CAP-0402
pins: 1, 2

## CC0402KRX7R9BB102
designator C?, comment 1nF
50V 1nF X7R ±10% 0402 Ceramic Capacitors ROHS; Manufacturer: YAGEO; Mfr.Part #: CC0402KRX7R9BB102; Package: 0402; LCSC Part #: C106205
footprint CAP-0402
pins: 1, 2

## CC0402KRX7R9BB103
designator C?, comment 10nF
CAP CER 10nF 50V X7R 0402; Manufacturer: YAGEO; Mfr.Part #: CC0402KRX7R9BB103; Package: 0402; LCSC Part #: C60133
footprint CAP-0402
pins: 1, 2

## CC0402KRX7R9BB153
designator C?, comment 15nF
CAP CER 15nF 50V X7R 0402; Manufacturer: YAGEO; Mfr.Part #: CC0402KRX7R9BB153; Package: 0402; LCSC Part #: C114405
footprint CAP-0402
pins: 1, 2

## CC0402KRX7R9BB222
designator C?, comment 2.2nF
CAP CER 2.2nF 50V X7R 0402; Manufacturer: YAGEO; Mfr.Part #: CC0402KRX7R9BB222; Package: 0402; LCSC Part #: C106861
footprint CAP-0402
pins: 1, 2

## CC0402KRX7R9BB563
designator C?, comment 56nF
50V 56nF X7R ±10% 0402 Multilayer Ceramic Capacitors MLCC - SMD/SMT ROHS; Manufacturer: YAGEO; Mfr.Part #: CC0402KRX7R9BB563; Package: 0402; LCSC Part #: C5182419
footprint CAP-0402
pins: 1, 2

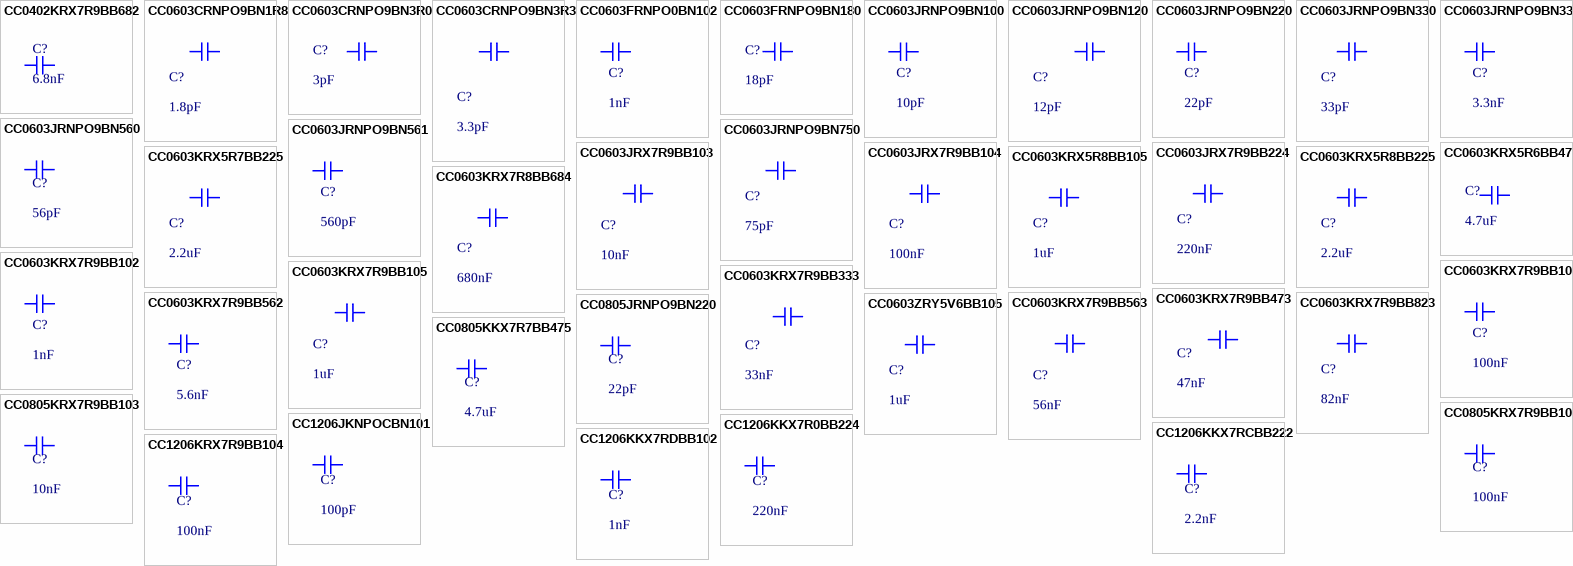
[diagram p15: symbols CC0402KRX7R9BB682 to CC1206KRX7R9BB104]

## CC0402KRX7R9BB682
designator C?, comment 6.8nF
6.8nF ±10% 50V Ceramic Capacitor X7R 0402; Manufacturer: YAGEO; Mfr.Part #: CC0402KRX7R9BB682; Package: 0402; LCSC Part #: C93654
footprint CAP-0402
pins: 1, 2

## CC0603CRNPO9BN1R8
designator C?, comment 1.8pF
1.8pF 50V Ceramic Capacitor NP0 0603; Manufacturer: YAGEO; Mfr.Part #: CC0603CRNPO9BN1R8; Package: 0603; LCSC Part #: C282244; DigiKey Part Number: 311-3852-2-ND; ComponentLink1Description: Link; ComponentLink1URL: https://www.lcsc.com/product-detail/C282244.html?spm=wm.fly.bg.2.xh&lcsc_vid=QwdcUVxUFAdbVwUFRQBWBVECTlNYX1QAQFddU1EFQ1kxVlNRQ1NeVF1TQVhaVTsOAxUeFF5JWBYZEEoKFBINSQcJGk4dAgUUFAk%3D; ComponentLink2Description: Link 1; ComponentLink2URL: https://www.digikey.com/en/products/detail/yageo/CC0603CRNPO9BN1R8/5883448?s=N4IgTCBcDaIMJwAwDZEGY4CUByAFA8gJwBC2AjJgBwgC6AvkA
footprint CAP-0603
pins: 1, 2

## CC0603CRNPO9BN3R0
designator C?, comment 3pF
50V 3pF NP0 0603 Multilayer Ceramic Capacitors MLCC - SMD/SMT ROHS; Manufacturer: YAGEO; Mfr.Part #: CC0603JRNPO9BN120; Package: 0603
footprint CAP-0603
pins: 1, 2

## CC0603CRNPO9BN3R3
designator C?, comment 3.3pF
50V 3.3pF NP0 0603 Multilayer Ceramic Capacitors MLCC - SMD/SMT ROHS; Manufacturer: YAGEO; Mfr.Part #: CC0603CRNPO9BN3R3; Package: 0603
footprint CAP-0603
pins: 1, 2

## CC0603FRNPO0BN102
designator C?, comment 1nF
100V 1nF NP0 ±1% 0603 Multilayer Ceramic Capacitors MLCC - SMD/SMT ROHS; Manufacturer: YAGEO; Mfr.Part #: CC0603FRNPO0BN102; Package: 0603; LCSC Part #: C576765
footprint CAP-0603
pins: 1, 2

## CC0603FRNPO9BN180
designator C?, comment 18pF
50V 18pF NP0 ±1% 0603 Multilayer Ceramic Capacitors MLCC - SMD/SMT ROHS; Manufacturer: YAGEO; Mfr.Part #: CC0603FRNPO9BN180; Package: 0603; LCSC Part #: C527046
footprint CAP-0603
pins: 1, 2

## CC0603JRNPO9BN100
designator C?, comment 10pF
10pF ±5% 50V Ceramic Capacitor NP0 0603; Manufacturer: YAGEO; Mfr.Part #: CC0603JRNPO9BN100; Package: 0603; LCSC Part #: C106245; DigiKey Part Number: 311-1058-2-ND; ComponentLink1Description: Link; ComponentLink1URL: https://www.lcsc.com/product-detail/C106245.html?s_z=n_10PF; ComponentLink2Description: Link 1; ComponentLink2URL: https://www.digikey.com/en/products/detail/yageo/CC0603JRNPO9BN100/302792?s=N4IgTCBcDaIMJwAwDZEGYBSAlAcgBQHkBOAIRwEZFEQBdAXyA
footprint CAP-0603
pins: 1, 2

## CC0603JRNPO9BN120
designator C?, comment 12pF
50V 12pF NP0 ±5% 0603 Multilayer Ceramic Capacitors MLCC - SMD/SMT ROHS; Manufacturer: YAGEO; Mfr.Part #: CC0603JRNPO9BN120; Package: 0603; LCSC Part #: C107034
footprint CAP-0603
pins: 1, 2

## CC0603JRNPO9BN220
designator C?, comment 22pF
22pF ±5% 50V Ceramic Capacitor NP0 0603; Manufacturer: YAGEO; Mfr.Part #: CC0603JRNPO9BN220; Package: 0603; LCSC Part #: C105620; DigiKey Part Number: 311-1062-2-ND; ComponentLink1Description: Link; ComponentLink1URL: https://www.lcsc.com/product-detail/C105620.html?s_z=n_CC0603JRNPO9BN220; ComponentLink2Description: Link 1; ComponentLink2URL: https://www.digikey.com/en/products/detail/yageo/CC0603JRNPO9BN220/302796?s=N4IgTCBcDaIMJwAwDZEGYBSAlAcgBQHkBOAIRzDERAF0BfIA
footprint CAP-0603
footprint CAP-0603-3
pins: 1, 2

## CC0603JRNPO9BN330
designator C?, comment 33pF
33pF ±5% 50V Ceramic Capacitor NP0 0603; Manufacturer: YAGEO; Mfr.Part #: CC0603JRNPO9BN330; Package: 0603; LCSC Part #: C107047; DigiKey Part Number: 311-1064-2-ND; ComponentLink1Description: Link; ComponentLink1URL: https://www.lcsc.com/product-detail/C107047.html; ComponentLink2Description: Link 1; ComponentLink2URL: https://www.digikey.com/en/products/detail/yageo/CC0603JRNPO9BN330/302798?s=N4IgTCBcDaIMJwAwDZEGYBSAlAcgBQHkBOAIRzTURAF0BfIA
footprint CAP-0603
pins: 1, 2

## CC0603JRNPO9BN332
designator C?, comment 3.3nF
3.3nF ±5% 50V Ceramic Capacitor NP0 0603; Manufacturer: YAGEO; Mfr.Part #: CC0603JRNPO9BN332; Package: 0603; LCSC Part #: C107048; DigiKey Part Number: 311-3968-2-ND; ComponentLink1Description: Link; ComponentLink1URL: https://www.lcsc.com/product-detail/C107048.html?s_z=n_3300PF; ComponentLink2Description: Link 1; ComponentLink2URL: https://www.digikey.com/en/products/detail/yageo/CC0603JRNPO9BN332/5883612?s=N4IgTCBcDaIMJwAwDZEGYBSAlAcgBQHkBOAIRzTQgF0BfIA
footprint CAP-0603
pins: 1, 2

## CC0603JRNPO9BN560
designator C?, comment 56pF